# Altium integrated library Samtec_2,54_mm_Pitch_Socket_Strips.IntLib: 489 symbols (part 4 of 4)
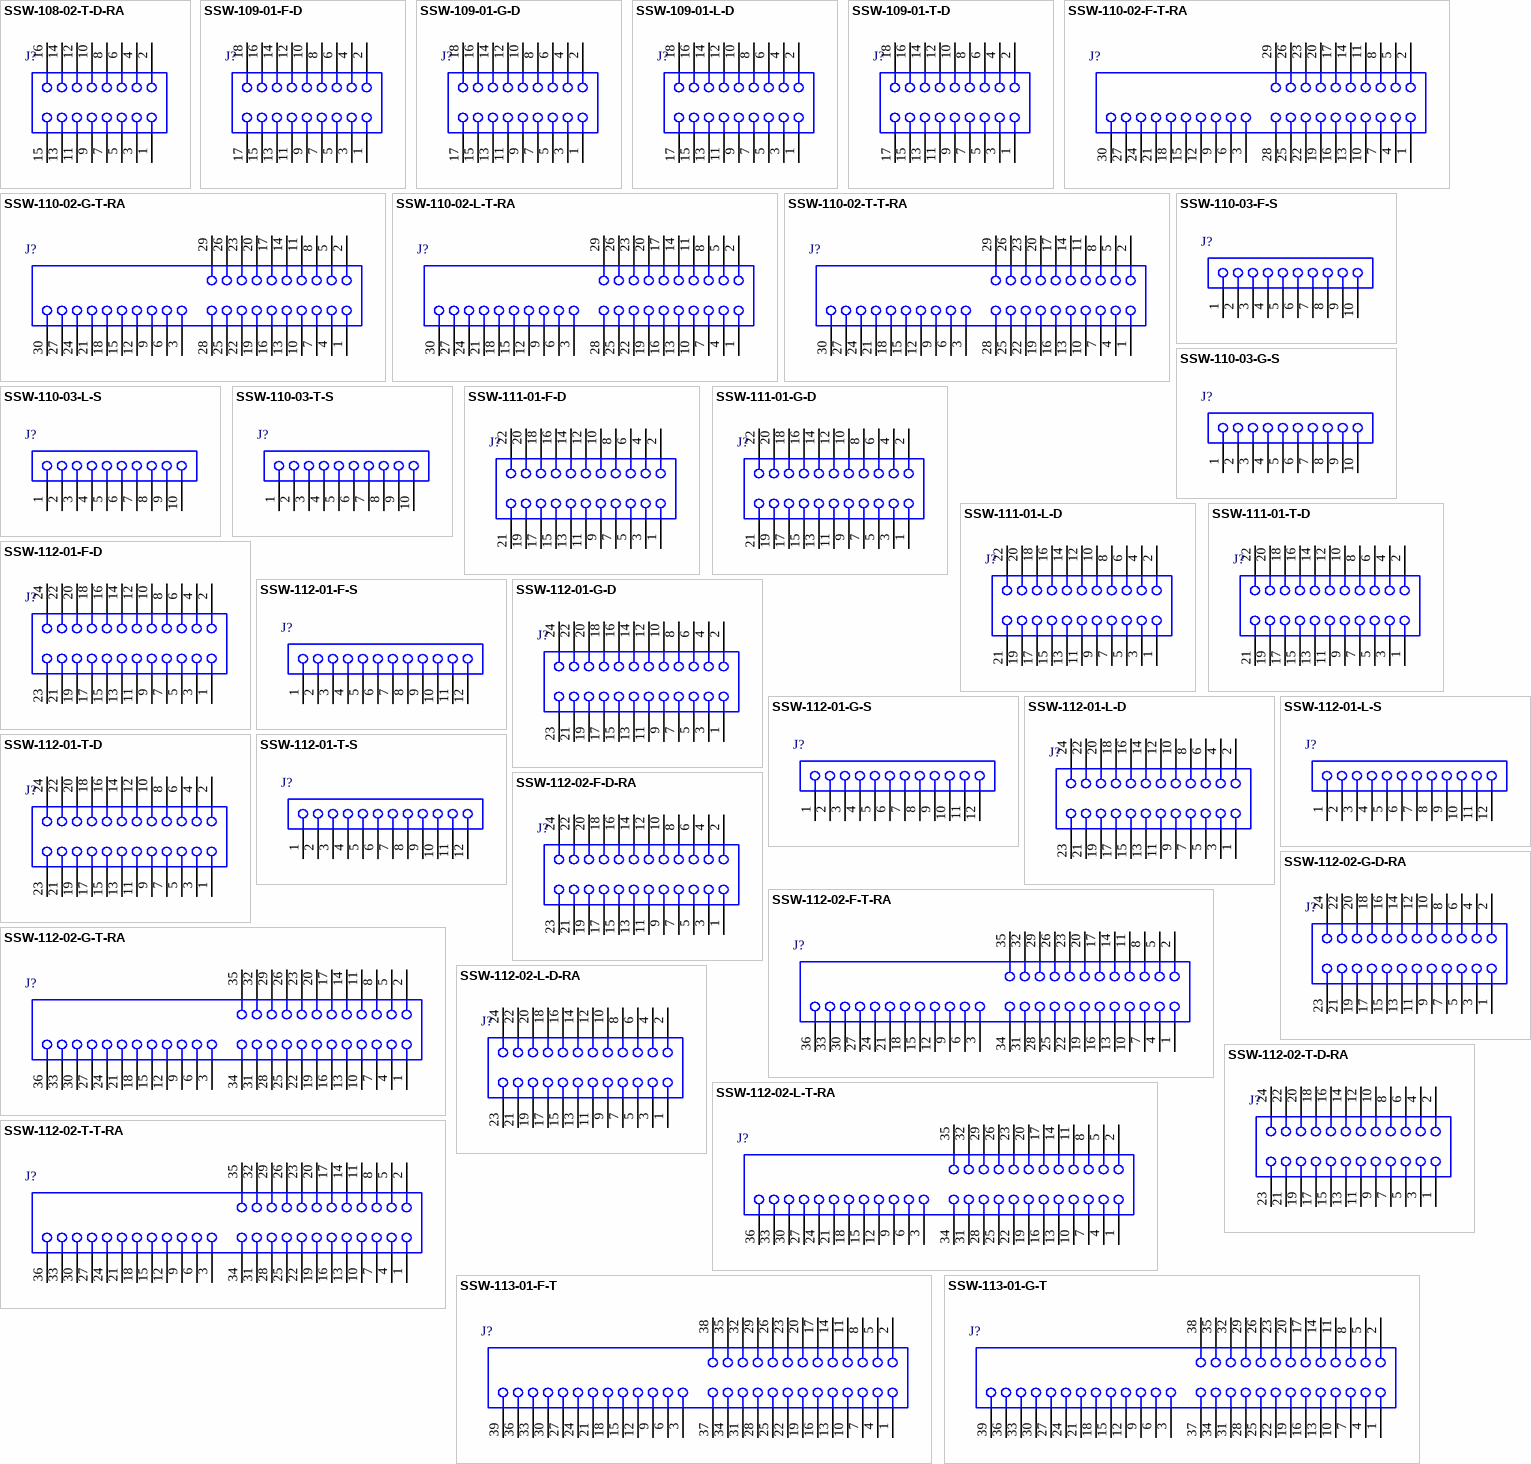
[diagram p16: symbols SSW-108-02-T-D-RA to SSW-113-01-G-T]

## SSW-112-01-L-S
designator J?
SQ Post Socket, Through-hole, Vertical, -55 to 125 degC, 2.54 mm Pitch, 12-Pin, Female, RoHS; Manufacturer: Samtec; PartNumber: SSW-112-01-L-S; Pitch: 2.54 mm; DatasheetVersion: F-214; PackageVersion: CA, 6/1987; PackageReference: SSW-112-01-X-S; PackageDescription: Assembly, Socket Strip .016 X .031 Tail; Orientation: Vertical; RoHS: True; Temperature Range: -55 to 125 degC; Mounting Technology: Through-hole; ComponentLink1Description: Manufacturer URL; ComponentLink1URL: http://www.samtec.com; ComponentLink2Description: Datasheet; ComponentLink2URL: http://www.samtec.com/documents/webfiles/pdf/SSW_TH.PDF; ComponentLink3Description: Package Specification; ComponentLink3URL: http://www.samtec.com/documents/webfiles/cpdf/SSW-1XX-XX-XXX-X-XX-XXX-XX-MKT.pdf
footprint SMTC-SSW-112-01-X-S (SQ Post Socket, 1x12 Pins, Vertical, 2.54mm Pitch, Female)
pins: 1, 2, 3, 4, 5, 6, 7, 8, 9, 10, 11, 12

## SSW-112-01-T-D
designator J?
SQ Post Socket, Through-hole, Vertical, -55 to 105 degC, 2.54 mm Pitch, 24-Pin, Female, RoHS; Manufacturer: Samtec; PartNumber: SSW-112-01-T-D; Pitch: 2.54 mm; DatasheetVersion: F-214; PackageVersion: CA, 6/1987; PackageReference: SSW-112-01-X-D; PackageDescription: Assembly, Socket Strip .016 X .031 Tail; Supplier 1: Digi-Key; Supplier Part Number 1: SAM1212-12-ND; Supplier 2: Newark; Supplier Part Number 2: 11P9507; Orientation: Vertical; RoHS: True; Temperature Range: -55 to 105 degC; Mounting Technology: Through-hole; ComponentLink1Description: Manufacturer URL; ComponentLink1URL: http://www.samtec.com; ComponentLink2Description: Datasheet; ComponentLink2URL: http://www.samtec.com/documents/webfiles/pdf/SSW_TH.PDF; ComponentLink3Description: Package Specification; ComponentLink3URL: http://www.samtec.com/documents/webfiles/cpdf/SSW-1XX-XX-XXX-X-XX-XXX-XX-MKT.pdf
footprint SMTC-SSW-112-01-X-D (SQ Post Socket, 2x12 Pins, Vertical, 2.54mm Pitch, Female)
pins: 1, 2, 3, 4, 5, 6, 7, 8, 9, 10, 11, 12, 13, 14, 15, 16, 17, 18, 19, 20, 21, 22, 23, 24

## SSW-112-01-T-S
designator J?
SQ Post Socket, Through-hole, Vertical, -55 to 105 degC, 2.54 mm Pitch, 12-Pin, Female, RoHS; Manufacturer: Samtec; PartNumber: SSW-112-01-T-S; Pitch: 2.54 mm; DatasheetVersion: F-214; PackageVersion: CA, 6/1987; PackageReference: SSW-112-01-X-S; PackageDescription: Assembly, Socket Strip .016 X .031 Tail; Supplier 1: Digi-Key; Supplier Part Number 1: SAM1213-12-ND; Supplier 2: Newark; Supplier Part Number 2: 11P9508; Orientation: Vertical; RoHS: True; Temperature Range: -55 to 105 degC; Mounting Technology: Through-hole; ComponentLink1Description: Manufacturer URL; ComponentLink1URL: http://www.samtec.com; ComponentLink2Description: Datasheet; ComponentLink2URL: http://www.samtec.com/documents/webfiles/pdf/SSW_TH.PDF; ComponentLink3Description: Package Specification; ComponentLink3URL: http://www.samtec.com/documents/webfiles/cpdf/SSW-1XX-XX-XXX-X-XX-XXX-XX-MKT.pdf
footprint SMTC-SSW-112-01-X-S (SQ Post Socket, 1x12 Pins, Vertical, 2.54mm Pitch, Female)
pins: 1, 2, 3, 4, 5, 6, 7, 8, 9, 10, 11, 12

## SSW-112-02-F-D-RA
designator J?
SQ Post Socket, Through-hole, Right Angle, -55 to 125 degC, 2.54 mm Pitch, 24-Pin, Female, RoHS; Manufacturer: Samtec; PartNumber: SSW-112-02-F-D-RA; Pitch: 2.54 mm; DatasheetVersion: F-214; PackageVersion: CA, 6/1987; PackageReference: SSW-112-02-X-D-RA; PackageDescription: Assembly, Socket Strip .016 X .031 Tail; Supplier 1: Newark; Supplier Part Number 1: 82P5836; Orientation: Right Angle; RoHS: True; Temperature Range: -55 to 125 degC; Mounting Technology: Through-hole; ComponentLink1Description: Manufacturer URL; ComponentLink1URL: http://www.samtec.com; ComponentLink2Description: Datasheet; ComponentLink2URL: http://www.samtec.com/documents/webfiles/pdf/SSW_TH.PDF; ComponentLink3Description: Package Specification; ComponentLink3URL: http://www.samtec.com/documents/webfiles/cpdf/SSW-1XX-XX-XXX-X-XX-XXX-XX-MKT.pdf
footprint SMTC-SSW-112-02-X-D-RA (SQ Post Socket, 2x12 Pins, Right Angle, 2.54mm Pitch, Female)
pins: 1, 2, 3, 4, 5, 6, 7, 8, 9, 10, 11, 12, 13, 14, 15, 16, 17, 18, 19, 20, 21, 22, 23, 24

## SSW-112-02-F-T-RA
designator J?
SQ Post Socket, Through-hole, Right Angle, -55 to 125 degC, 2.54 mm Pitch, 36-Pin, Female, RoHS; Manufacturer: Samtec; PartNumber: SSW-112-02-F-T-RA; Pitch: 2.54 mm; DatasheetVersion: F-214; PackageVersion: CA, 6/1987; PackageReference: SSW-112-02-X-T-RA; PackageDescription: Assembly, Socket Strip .016 X .031 Tail; Orientation: Right Angle; RoHS: True; Temperature Range: -55 to 125 degC; Mounting Technology: Through-hole; ComponentLink1Description: Manufacturer URL; ComponentLink1URL: http://www.samtec.com; ComponentLink2Description: Datasheet; ComponentLink2URL: http://www.samtec.com/documents/webfiles/pdf/SSW_TH.PDF; ComponentLink3Description: Package Specification; ComponentLink3URL: http://www.samtec.com/documents/webfiles/cpdf/SSW-1XX-XX-XXX-X-XX-XXX-XX-MKT.pdf
footprint SMTC-SSW-112-02-X-T-RA (SQ Post Socket, 3x12 Pins, Right Angle, 2.54mm Pitch, Female)
pins: 1, 2, 3, 4, 5, 6, 7, 8, 9, 10, 11, 12, 13, 14, 15, 16, 17, 18, 19, 20, 21, 22, 23, 24, 25, 26, 27, 28, 29, 30, 31, 32, 33, 34, 35, 36

## SSW-112-02-G-D-RA
designator J?
SQ Post Socket, Through-hole, Right Angle, -55 to 125 degC, 2.54 mm Pitch, 24-Pin, Female, RoHS; Manufacturer: Samtec; PartNumber: SSW-112-02-G-D-RA; Pitch: 2.54 mm; DatasheetVersion: F-214; PackageVersion: CA, 6/1987; PackageReference: SSW-112-02-X-D-RA; PackageDescription: Assembly, Socket Strip .016 X .031 Tail; Supplier 1: Digi-Key; Supplier Part Number 1: SAM1215-12-ND; Supplier 2: Newark; Supplier Part Number 2: 11P9510; Orientation: Right Angle; RoHS: True; Temperature Range: -55 to 125 degC; Mounting Technology: Through-hole; ComponentLink1Description: Manufacturer URL; ComponentLink1URL: http://www.samtec.com; ComponentLink2Description: Datasheet; ComponentLink2URL: http://www.samtec.com/documents/webfiles/pdf/SSW_TH.PDF; ComponentLink3Description: Package Specification; ComponentLink3URL: http://www.samtec.com/documents/webfiles/cpdf/SSW-1XX-XX-XXX-X-XX-XXX-XX-MKT.pdf
footprint SMTC-SSW-112-02-X-D-RA (SQ Post Socket, 2x12 Pins, Right Angle, 2.54mm Pitch, Female)
pins: 1, 2, 3, 4, 5, 6, 7, 8, 9, 10, 11, 12, 13, 14, 15, 16, 17, 18, 19, 20, 21, 22, 23, 24

## SSW-112-02-G-T-RA
designator J?
SQ Post Socket, Through-hole, Right Angle, -55 to 125 degC, 2.54 mm Pitch, 36-Pin, Female, RoHS; Manufacturer: Samtec; PartNumber: SSW-112-02-G-T-RA; Pitch: 2.54 mm; DatasheetVersion: F-214; PackageVersion: CA, 6/1987; PackageReference: SSW-112-02-X-T-RA; PackageDescription: Assembly, Socket Strip .016 X .031 Tail; Supplier 1: Newark; Supplier Part Number 1: 82P5862; Orientation: Right Angle; RoHS: True; Temperature Range: -55 to 125 degC; Mounting Technology: Through-hole; ComponentLink1Description: Manufacturer URL; ComponentLink1URL: http://www.samtec.com; ComponentLink2Description: Datasheet; ComponentLink2URL: http://www.samtec.com/documents/webfiles/pdf/SSW_TH.PDF; ComponentLink3Description: Package Specification; ComponentLink3URL: http://www.samtec.com/documents/webfiles/cpdf/SSW-1XX-XX-XXX-X-XX-XXX-XX-MKT.pdf
footprint SMTC-SSW-112-02-X-T-RA (SQ Post Socket, 3x12 Pins, Right Angle, 2.54mm Pitch, Female)
pins: 1, 2, 3, 4, 5, 6, 7, 8, 9, 10, 11, 12, 13, 14, 15, 16, 17, 18, 19, 20, 21, 22, 23, 24, 25, 26, 27, 28, 29, 30, 31, 32, 33, 34, 35, 36

## SSW-112-02-L-D-RA
designator J?
SQ Post Socket, Through-hole, Right Angle, -55 to 125 degC, 2.54 mm Pitch, 24-Pin, Female, RoHS; Manufacturer: Samtec; PartNumber: SSW-112-02-L-D-RA; Pitch: 2.54 mm; DatasheetVersion: F-214; PackageVersion: CA, 6/1987; PackageReference: SSW-112-02-X-D-RA; PackageDescription: Assembly, Socket Strip .016 X .031 Tail; Orientation: Right Angle; RoHS: True; Temperature Range: -55 to 125 degC; Mounting Technology: Through-hole; ComponentLink1Description: Manufacturer URL; ComponentLink1URL: http://www.samtec.com; ComponentLink2Description: Datasheet; ComponentLink2URL: http://www.samtec.com/documents/webfiles/pdf/SSW_TH.PDF; ComponentLink3Description: Package Specification; ComponentLink3URL: http://www.samtec.com/documents/webfiles/cpdf/SSW-1XX-XX-XXX-X-XX-XXX-XX-MKT.pdf
footprint SMTC-SSW-112-02-X-D-RA (SQ Post Socket, 2x12 Pins, Right Angle, 2.54mm Pitch, Female)
pins: 1, 2, 3, 4, 5, 6, 7, 8, 9, 10, 11, 12, 13, 14, 15, 16, 17, 18, 19, 20, 21, 22, 23, 24

## SSW-112-02-L-T-RA
designator J?
SQ Post Socket, Through-hole, Right Angle, -55 to 125 degC, 2.54 mm Pitch, 36-Pin, Female, RoHS; Manufacturer: Samtec; PartNumber: SSW-112-02-L-T-RA; Pitch: 2.54 mm; DatasheetVersion: F-214; PackageVersion: CA, 6/1987; PackageReference: SSW-112-02-X-T-RA; PackageDescription: Assembly, Socket Strip .016 X .031 Tail; Orientation: Right Angle; RoHS: True; Temperature Range: -55 to 125 degC; Mounting Technology: Through-hole; ComponentLink1Description: Manufacturer URL; ComponentLink1URL: http://www.samtec.com; ComponentLink2Description: Datasheet; ComponentLink2URL: http://www.samtec.com/documents/webfiles/pdf/SSW_TH.PDF; ComponentLink3Description: Package Specification; ComponentLink3URL: http://www.samtec.com/documents/webfiles/cpdf/SSW-1XX-XX-XXX-X-XX-XXX-XX-MKT.pdf
footprint SMTC-SSW-112-02-X-T-RA (SQ Post Socket, 3x12 Pins, Right Angle, 2.54mm Pitch, Female)
pins: 1, 2, 3, 4, 5, 6, 7, 8, 9, 10, 11, 12, 13, 14, 15, 16, 17, 18, 19, 20, 21, 22, 23, 24, 25, 26, 27, 28, 29, 30, 31, 32, 33, 34, 35, 36

## SSW-112-02-T-D-RA
designator J?
SQ Post Socket, Through-hole, Right Angle, -55 to 105 degC, 2.54 mm Pitch, 24-Pin, Female, RoHS; Manufacturer: Samtec; PartNumber: SSW-112-02-T-D-RA; Pitch: 2.54 mm; DatasheetVersion: F-214; PackageVersion: CA, 6/1987; PackageReference: SSW-112-02-X-D-RA; PackageDescription: Assembly, Socket Strip .016 X .031 Tail; Supplier 1: Newark; Supplier Part Number 1: 82P5889; Orientation: Right Angle; RoHS: True; Temperature Range: -55 to 105 degC; Mounting Technology: Through-hole; ComponentLink1Description: Manufacturer URL; ComponentLink1URL: http://www.samtec.com; ComponentLink2Description: Datasheet; ComponentLink2URL: http://www.samtec.com/documents/webfiles/pdf/SSW_TH.PDF; ComponentLink3Description: Package Specification; ComponentLink3URL: http://www.samtec.com/documents/webfiles/cpdf/SSW-1XX-XX-XXX-X-XX-XXX-XX-MKT.pdf
footprint SMTC-SSW-112-02-X-D-RA (SQ Post Socket, 2x12 Pins, Right Angle, 2.54mm Pitch, Female)
pins: 1, 2, 3, 4, 5, 6, 7, 8, 9, 10, 11, 12, 13, 14, 15, 16, 17, 18, 19, 20, 21, 22, 23, 24

## SSW-112-02-T-T-RA
designator J?
SQ Post Socket, Through-hole, Right Angle, -55 to 105 degC, 2.54 mm Pitch, 36-Pin, Female, RoHS; Manufacturer: Samtec; PartNumber: SSW-112-02-T-T-RA; Pitch: 2.54 mm; DatasheetVersion: F-214; PackageVersion: CA, 6/1987; PackageReference: SSW-112-02-X-T-RA; PackageDescription: Assembly, Socket Strip .016 X .031 Tail; Supplier 1: Newark; Supplier Part Number 1: 82P5899; Orientation: Right Angle; RoHS: True; Temperature Range: -55 to 105 degC; Mounting Technology: Through-hole; ComponentLink1Description: Manufacturer URL; ComponentLink1URL: http://www.samtec.com; ComponentLink2Description: Datasheet; ComponentLink2URL: http://www.samtec.com/documents/webfiles/pdf/SSW_TH.PDF; ComponentLink3Description: Package Specification; ComponentLink3URL: http://www.samtec.com/documents/webfiles/cpdf/SSW-1XX-XX-XXX-X-XX-XXX-XX-MKT.pdf
footprint SMTC-SSW-112-02-X-T-RA (SQ Post Socket, 3x12 Pins, Right Angle, 2.54mm Pitch, Female)
pins: 1, 2, 3, 4, 5, 6, 7, 8, 9, 10, 11, 12, 13, 14, 15, 16, 17, 18, 19, 20, 21, 22, 23, 24, 25, 26, 27, 28, 29, 30, 31, 32, 33, 34, 35, 36

## SSW-113-01-F-T
designator J?
SQ Post Socket, Through-hole, Vertical, -55 to 125 degC, 2.54 mm Pitch, 39-Pin, Female, RoHS; Manufacturer: Samtec; PartNumber: SSW-113-01-F-T; Pitch: 2.54 mm; DatasheetVersion: F-214; PackageVersion: CA, 6/1987; PackageReference: SSW-113-01-X-T; PackageDescription: Assembly, Socket Strip .016 X .031 Tail; Orientation: Vertical; RoHS: True; Temperature Range: -55 to 125 degC; Mounting Technology: Through-hole; ComponentLink1Description: Manufacturer URL; ComponentLink1URL: http://www.samtec.com; ComponentLink2Description: Datasheet; ComponentLink2URL: http://www.samtec.com/documents/webfiles/pdf/SSW_TH.PDF; ComponentLink3Description: Package Specification; ComponentLink3URL: http://www.samtec.com/documents/webfiles/cpdf/SSW-1XX-XX-XXX-X-XX-XXX-XX-MKT.pdf
footprint SMTC-SSW-113-01-X-T (SQ Post Socket, 3x13 Pins, Vertical, 2.54mm Pitch, Female)
pins: 1, 2, 3, 4, 5, 6, 7, 8, 9, 10, 11, 12, 13, 14, 15, 16, 17, 18, 19, 20, 21, 22, 23, 24, 25, 26, 27, 28, 29, 30, 31, 32, 33, 34, 35, 36, 37, 38, 39

## SSW-113-01-G-T
designator J?
SQ Post Socket, Through-hole, Vertical, -55 to 125 degC, 2.54 mm Pitch, 39-Pin, Female, RoHS; Manufacturer: Samtec; PartNumber: SSW-113-01-G-T; Pitch: 2.54 mm; DatasheetVersion: F-214; PackageVersion: CA, 6/1987; PackageReference: SSW-113-01-X-T; PackageDescription: Assembly, Socket Strip .016 X .031 Tail; Supplier 1: Newark; Supplier Part Number 1: 82P6213; Orientation: Vertical; RoHS: True; Temperature Range: -55 to 125 degC; Mounting Technology: Through-hole; ComponentLink1Description: Manufacturer URL; ComponentLink1URL: http://www.samtec.com; ComponentLink2Description: Datasheet; ComponentLink2URL: http://www.samtec.com/documents/webfiles/pdf/SSW_TH.PDF; ComponentLink3Description: Package Specification; ComponentLink3URL: http://www.samtec.com/documents/webfiles/cpdf/SSW-1XX-XX-XXX-X-XX-XXX-XX-MKT.pdf
footprint SMTC-SSW-113-01-X-T (SQ Post Socket, 3x13 Pins, Vertical, 2.54mm Pitch, Female)
pins: 1, 2, 3, 4, 5, 6, 7, 8, 9, 10, 11, 12, 13, 14, 15, 16, 17, 18, 19, 20, 21, 22, 23, 24, 25, 26, 27, 28, 29, 30, 31, 32, 33, 34, 35, 36, 37, 38, 39

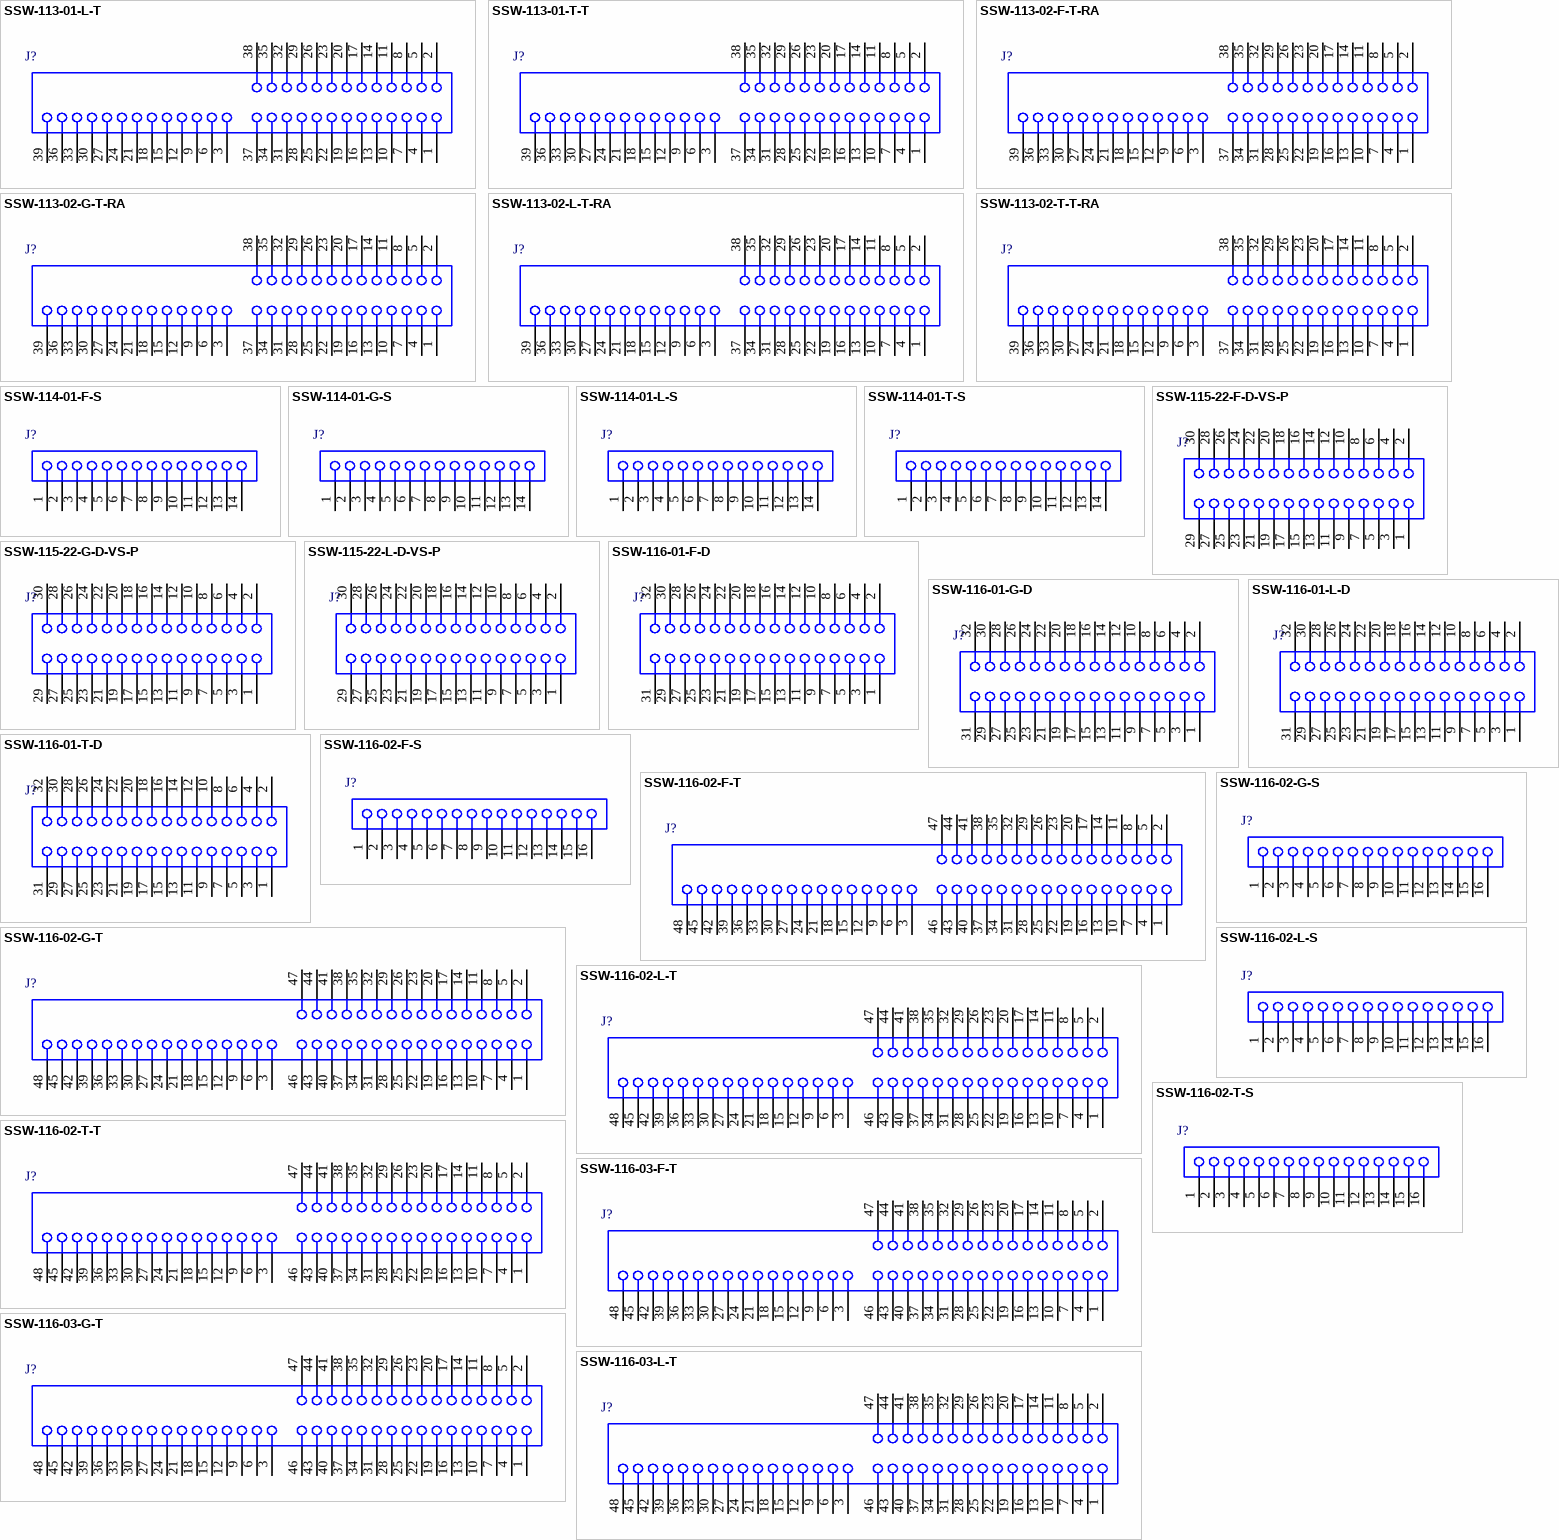
[diagram p11: symbols SSW-113-01-L-T to SSW-116-03-L-T]

## SSW-113-01-L-T
designator J?
SQ Post Socket, Through-hole, Vertical, -55 to 125 degC, 2.54 mm Pitch, 39-Pin, Female, RoHS; Manufacturer: Samtec; PartNumber: SSW-113-01-L-T; Pitch: 2.54 mm; DatasheetVersion: F-214; PackageVersion: CA, 6/1987; PackageReference: SSW-113-01-X-T; PackageDescription: Assembly, Socket Strip .016 X .031 Tail; Orientation: Vertical; RoHS: True; Temperature Range: -55 to 125 degC; Mounting Technology: Through-hole; ComponentLink1Description: Manufacturer URL; ComponentLink1URL: http://www.samtec.com; ComponentLink2Description: Datasheet; ComponentLink2URL: http://www.samtec.com/documents/webfiles/pdf/SSW_TH.PDF; ComponentLink3Description: Package Specification; ComponentLink3URL: http://www.samtec.com/documents/webfiles/cpdf/SSW-1XX-XX-XXX-X-XX-XXX-XX-MKT.pdf
footprint SMTC-SSW-113-01-X-T (SQ Post Socket, 3x13 Pins, Vertical, 2.54mm Pitch, Female)
pins: 1, 2, 3, 4, 5, 6, 7, 8, 9, 10, 11, 12, 13, 14, 15, 16, 17, 18, 19, 20, 21, 22, 23, 24, 25, 26, 27, 28, 29, 30, 31, 32, 33, 34, 35, 36, 37, 38, 39

## SSW-113-01-T-T
designator J?
SQ Post Socket, Through-hole, Vertical, -55 to 105 degC, 2.54 mm Pitch, 39-Pin, Female, RoHS; Manufacturer: Samtec; PartNumber: SSW-113-01-T-T; Pitch: 2.54 mm; DatasheetVersion: F-214; PackageVersion: CA, 6/1987; PackageReference: SSW-113-01-X-T; PackageDescription: Assembly, Socket Strip .016 X .031 Tail; Supplier 1: Newark; Supplier Part Number 1: 82P6233; Orientation: Vertical; RoHS: True; Temperature Range: -55 to 105 degC; Mounting Technology: Through-hole; ComponentLink1Description: Manufacturer URL; ComponentLink1URL: http://www.samtec.com; ComponentLink2Description: Datasheet; ComponentLink2URL: http://www.samtec.com/documents/webfiles/pdf/SSW_TH.PDF; ComponentLink3Description: Package Specification; ComponentLink3URL: http://www.samtec.com/documents/webfiles/cpdf/SSW-1XX-XX-XXX-X-XX-XXX-XX-MKT.pdf
footprint SMTC-SSW-113-01-X-T (SQ Post Socket, 3x13 Pins, Vertical, 2.54mm Pitch, Female)
pins: 1, 2, 3, 4, 5, 6, 7, 8, 9, 10, 11, 12, 13, 14, 15, 16, 17, 18, 19, 20, 21, 22, 23, 24, 25, 26, 27, 28, 29, 30, 31, 32, 33, 34, 35, 36, 37, 38, 39

## SSW-113-02-F-T-RA
designator J?
SQ Post Socket, Through-hole, Right Angle, -55 to 125 degC, 2.54 mm Pitch, 39-Pin, Female, RoHS; Manufacturer: Samtec; PartNumber: SSW-113-02-F-T-RA; Pitch: 2.54 mm; DatasheetVersion: F-214; PackageVersion: CA, 6/1987; PackageReference: SSW-113-02-X-T-RA; PackageDescription: Assembly, Socket Strip .016 X .031 Tail; Orientation: Right Angle; RoHS: True; Temperature Range: -55 to 125 degC; Mounting Technology: Through-hole; ComponentLink1Description: Manufacturer URL; ComponentLink1URL: http://www.samtec.com; ComponentLink2Description: Datasheet; ComponentLink2URL: http://www.samtec.com/documents/webfiles/pdf/SSW_TH.PDF; ComponentLink3Description: Package Specification; ComponentLink3URL: http://www.samtec.com/documents/webfiles/cpdf/SSW-1XX-XX-XXX-X-XX-XXX-XX-MKT.pdf
footprint SMTC-SSW-113-02-X-T-RA (SQ Post Socket, 3x13 Pins, Right Angle, 2.54mm Pitch, Female)
pins: 1, 2, 3, 4, 5, 6, 7, 8, 9, 10, 11, 12, 13, 14, 15, 16, 17, 18, 19, 20, 21, 22, 23, 24, 25, 26, 27, 28, 29, 30, 31, 32, 33, 34, 35, 36, 37, 38, 39

## SSW-113-02-G-T-RA
designator J?
SQ Post Socket, Through-hole, Right Angle, -55 to 125 degC, 2.54 mm Pitch, 39-Pin, Female, RoHS; Manufacturer: Samtec; PartNumber: SSW-113-02-G-T-RA; Pitch: 2.54 mm; DatasheetVersion: F-214; PackageVersion: CA, 6/1987; PackageReference: SSW-113-02-X-T-RA; PackageDescription: Assembly, Socket Strip .016 X .031 Tail; Supplier 1: Newark; Supplier Part Number 1: 82P6261; Orientation: Right Angle; RoHS: True; Temperature Range: -55 to 125 degC; Mounting Technology: Through-hole; ComponentLink1Description: Manufacturer URL; ComponentLink1URL: http://www.samtec.com; ComponentLink2Description: Datasheet; ComponentLink2URL: http://www.samtec.com/documents/webfiles/pdf/SSW_TH.PDF; ComponentLink3Description: Package Specification; ComponentLink3URL: http://www.samtec.com/documents/webfiles/cpdf/SSW-1XX-XX-XXX-X-XX-XXX-XX-MKT.pdf
footprint SMTC-SSW-113-02-X-T-RA (SQ Post Socket, 3x13 Pins, Right Angle, 2.54mm Pitch, Female)
pins: 1, 2, 3, 4, 5, 6, 7, 8, 9, 10, 11, 12, 13, 14, 15, 16, 17, 18, 19, 20, 21, 22, 23, 24, 25, 26, 27, 28, 29, 30, 31, 32, 33, 34, 35, 36, 37, 38, 39

## SSW-113-02-L-T-RA
designator J?
SQ Post Socket, Through-hole, Right Angle, -55 to 125 degC, 2.54 mm Pitch, 39-Pin, Female, RoHS; Manufacturer: Samtec; PartNumber: SSW-113-02-L-T-RA; Pitch: 2.54 mm; DatasheetVersion: F-214; PackageVersion: CA, 6/1987; PackageReference: SSW-113-02-X-T-RA; PackageDescription: Assembly, Socket Strip .016 X .031 Tail; Orientation: Right Angle; RoHS: True; Temperature Range: -55 to 125 degC; Mounting Technology: Through-hole; ComponentLink1Description: Manufacturer URL; ComponentLink1URL: http://www.samtec.com; ComponentLink2Description: Datasheet; ComponentLink2URL: http://www.samtec.com/documents/webfiles/pdf/SSW_TH.PDF; ComponentLink3Description: Package Specification; ComponentLink3URL: http://www.samtec.com/documents/webfiles/cpdf/SSW-1XX-XX-XXX-X-XX-XXX-XX-MKT.pdf
footprint SMTC-SSW-113-02-X-T-RA (SQ Post Socket, 3x13 Pins, Right Angle, 2.54mm Pitch, Female)
pins: 1, 2, 3, 4, 5, 6, 7, 8, 9, 10, 11, 12, 13, 14, 15, 16, 17, 18, 19, 20, 21, 22, 23, 24, 25, 26, 27, 28, 29, 30, 31, 32, 33, 34, 35, 36, 37, 38, 39

## SSW-113-02-T-T-RA
designator J?
SQ Post Socket, Through-hole, Right Angle, -55 to 105 degC, 2.54 mm Pitch, 39-Pin, Female, RoHS; Manufacturer: Samtec; PartNumber: SSW-113-02-T-T-RA; Pitch: 2.54 mm; DatasheetVersion: F-214; PackageVersion: CA, 6/1987; PackageReference: SSW-113-02-X-T-RA; PackageDescription: Assembly, Socket Strip .016 X .031 Tail; Supplier 1: Newark; Supplier Part Number 1: 82P6285; Orientation: Right Angle; RoHS: True; Temperature Range: -55 to 105 degC; Mounting Technology: Through-hole; ComponentLink1Description: Manufacturer URL; ComponentLink1URL: http://www.samtec.com; ComponentLink2Description: Datasheet; ComponentLink2URL: http://www.samtec.com/documents/webfiles/pdf/SSW_TH.PDF; ComponentLink3Description: Package Specification; ComponentLink3URL: http://www.samtec.com/documents/webfiles/cpdf/SSW-1XX-XX-XXX-X-XX-XXX-XX-MKT.pdf
footprint SMTC-SSW-113-02-X-T-RA (SQ Post Socket, 3x13 Pins, Right Angle, 2.54mm Pitch, Female)
pins: 1, 2, 3, 4, 5, 6, 7, 8, 9, 10, 11, 12, 13, 14, 15, 16, 17, 18, 19, 20, 21, 22, 23, 24, 25, 26, 27, 28, 29, 30, 31, 32, 33, 34, 35, 36, 37, 38, 39

## SSW-114-01-F-S
designator J?
SQ Post Socket, Through-hole, Vertical, -55 to 125 degC, 2.54 mm Pitch, 14-Pin, Female, RoHS; Manufacturer: Samtec; PartNumber: SSW-114-01-F-S; Pitch: 2.54 mm; DatasheetVersion: F-214; PackageVersion: CA, 6/1987; PackageReference: SSW-114-01-X-S; PackageDescription: Assembly, Socket Strip .016 X .031 Tail; Orientation: Vertical; RoHS: True; Temperature Range: -55 to 125 degC; Mounting Technology: Through-hole; ComponentLink1Description: Manufacturer URL; ComponentLink1URL: http://www.samtec.com; ComponentLink2Description: Datasheet; ComponentLink2URL: http://www.samtec.com/documents/webfiles/pdf/SSW_TH.PDF; ComponentLink3Description: Package Specification; ComponentLink3URL: http://www.samtec.com/documents/webfiles/cpdf/SSW-1XX-XX-XXX-X-XX-XXX-XX-MKT.pdf
footprint SMTC-SSW-114-01-X-S (SQ Post Socket, 1x14 Pins, Vertical, 2.54mm Pitch, Female)
pins: 1, 2, 3, 4, 5, 6, 7, 8, 9, 10, 11, 12, 13, 14

## SSW-114-01-G-S
designator J?
SQ Post Socket, Through-hole, Vertical, -55 to 125 degC, 2.54 mm Pitch, 14-Pin, Female, RoHS; Manufacturer: Samtec; PartNumber: SSW-114-01-G-S; Pitch: 2.54 mm; DatasheetVersion: F-214; PackageVersion: CA, 6/1987; PackageReference: SSW-114-01-X-S; PackageDescription: Assembly, Socket Strip .016 X .031 Tail; Supplier 1: Digi-Key; Supplier Part Number 1: SAM1209-14-ND; Supplier 2: Newark; Supplier Part Number 2: 11P9538; Orientation: Vertical; RoHS: True; Temperature Range: -55 to 125 degC; Mounting Technology: Through-hole; ComponentLink1Description: Manufacturer URL; ComponentLink1URL: http://www.samtec.com; ComponentLink2Description: Datasheet; ComponentLink2URL: http://www.samtec.com/documents/webfiles/pdf/SSW_TH.PDF; ComponentLink3Description: Package Specification; ComponentLink3URL: http://www.samtec.com/documents/webfiles/cpdf/SSW-1XX-XX-XXX-X-XX-XXX-XX-MKT.pdf
footprint SMTC-SSW-114-01-X-S (SQ Post Socket, 1x14 Pins, Vertical, 2.54mm Pitch, Female)
pins: 1, 2, 3, 4, 5, 6, 7, 8, 9, 10, 11, 12, 13, 14

## SSW-114-01-L-S
designator J?
SQ Post Socket, Through-hole, Vertical, -55 to 125 degC, 2.54 mm Pitch, 14-Pin, Female, RoHS; Manufacturer: Samtec; PartNumber: SSW-114-01-L-S; Pitch: 2.54 mm; DatasheetVersion: F-214; PackageVersion: CA, 6/1987; PackageReference: SSW-114-01-X-S; PackageDescription: Assembly, Socket Strip .016 X .031 Tail; Orientation: Vertical; RoHS: True; Temperature Range: -55 to 125 degC; Mounting Technology: Through-hole; ComponentLink1Description: Manufacturer URL; ComponentLink1URL: http://www.samtec.com; ComponentLink2Description: Datasheet; ComponentLink2URL: http://www.samtec.com/documents/webfiles/pdf/SSW_TH.PDF; ComponentLink3Description: Package Specification; ComponentLink3URL: http://www.samtec.com/documents/webfiles/cpdf/SSW-1XX-XX-XXX-X-XX-XXX-XX-MKT.pdf
footprint SMTC-SSW-114-01-X-S (SQ Post Socket, 1x14 Pins, Vertical, 2.54mm Pitch, Female)
pins: 1, 2, 3, 4, 5, 6, 7, 8, 9, 10, 11, 12, 13, 14

## SSW-114-01-T-S
designator J?
SQ Post Socket, Through-hole, Vertical, -55 to 105 degC, 2.54 mm Pitch, 14-Pin, Female, RoHS; Manufacturer: Samtec; PartNumber: SSW-114-01-T-S; Pitch: 2.54 mm; DatasheetVersion: F-214; PackageVersion: CA, 6/1987; PackageReference: SSW-114-01-X-S; PackageDescription: Assembly, Socket Strip .016 X .031 Tail; Supplier 1: Digi-Key; Supplier Part Number 1: SAM1213-14-ND; Supplier 2: Newark; Supplier Part Number 2: 11P9542; Orientation: Vertical; RoHS: True; Temperature Range: -55 to 105 degC; Mounting Technology: Through-hole; ComponentLink1Description: Manufacturer URL; ComponentLink1URL: http://www.samtec.com; ComponentLink2Description: Datasheet; ComponentLink2URL: http://www.samtec.com/documents/webfiles/pdf/SSW_TH.PDF; ComponentLink3Description: Package Specification; ComponentLink3URL: http://www.samtec.com/documents/webfiles/cpdf/SSW-1XX-XX-XXX-X-XX-XXX-XX-MKT.pdf
footprint SMTC-SSW-114-01-X-S (SQ Post Socket, 1x14 Pins, Vertical, 2.54mm Pitch, Female)
pins: 1, 2, 3, 4, 5, 6, 7, 8, 9, 10, 11, 12, 13, 14

## SSW-115-22-F-D-VS-P
designator J?
SQ Post Socket, Surface Mount, Vertical, -55 to 125 degC, 2.54 mm Pitch, 30-Pin, Female, RoHS; Manufacturer: Samtec; PartNumber: SSW-115-22-F-D-VS-P; Pitch: 2.54 mm; DatasheetVersion: F-214; PackageVersion: AS, 1/1997; PackageReference: SSW-115-22-X-D-VS-P; PackageDescription: .100 [2.54] Surface Mount Assembly; Orientation: Vertical; RoHS: True; Temperature Range: -55 to 125 degC; Mounting Technology: Surface Mount; ComponentLink1Description: Manufacturer URL; ComponentLink1URL: http://www.samtec.com; ComponentLink2Description: Datasheet; ComponentLink2URL: http://www.samtec.com/documents/webfiles/pdf/SSW_SM.PDF; ComponentLink3Description: Package Specification; ComponentLink3URL: http://www.samtec.com/documents/webfiles/cpdf/SSW-1XX-22-XXX-X-XX-XX-X-XX-MKT.pdf
footprint SMTC-SSW-115-22-X-D-VS-P (SQ Post Socket, 2x15 Pins, Vertical, 2.54mm Pitch, Female)
pins: 1, 2, 3, 4, 5, 6, 7, 8, 9, 10, 11, 12, 13, 14, 15, 16, 17, 18, 19, 20, 21, 22, 23, 24, 25, 26, 27, 28, 29, 30

## SSW-115-22-G-D-VS-P
designator J?
SQ Post Socket, Surface Mount, Vertical, -55 to 125 degC, 2.54 mm Pitch, 30-Pin, Female, RoHS; Manufacturer: Samtec; PartNumber: SSW-115-22-G-D-VS-P; Pitch: 2.54 mm; DatasheetVersion: F-214; PackageVersion: AS, 1/1997; PackageReference: SSW-115-22-X-D-VS-P; PackageDescription: .100 [2.54] Surface Mount Assembly; Orientation: Vertical; RoHS: True; Temperature Range: -55 to 125 degC; Mounting Technology: Surface Mount; ComponentLink1Description: Manufacturer URL; ComponentLink1URL: http://www.samtec.com; ComponentLink2Description: Datasheet; ComponentLink2URL: http://www.samtec.com/documents/webfiles/pdf/SSW_SM.PDF; ComponentLink3Description: Package Specification; ComponentLink3URL: http://www.samtec.com/documents/webfiles/cpdf/SSW-1XX-22-XXX-X-XX-XX-X-XX-MKT.pdf
footprint SMTC-SSW-115-22-X-D-VS-P (SQ Post Socket, 2x15 Pins, Vertical, 2.54mm Pitch, Female)
pins: 1, 2, 3, 4, 5, 6, 7, 8, 9, 10, 11, 12, 13, 14, 15, 16, 17, 18, 19, 20, 21, 22, 23, 24, 25, 26, 27, 28, 29, 30

## SSW-115-22-L-D-VS-P
designator J?
SQ Post Socket, Surface Mount, Vertical, -55 to 125 degC, 2.54 mm Pitch, 30-Pin, Female, RoHS; Manufacturer: Samtec; PartNumber: SSW-115-22-L-D-VS-P; Pitch: 2.54 mm; DatasheetVersion: F-214; PackageVersion: AS, 1/1997; PackageReference: SSW-115-22-X-D-VS-P; PackageDescription: .100 [2.54] Surface Mount Assembly; Orientation: Vertical; RoHS: True; Temperature Range: -55 to 125 degC; Mounting Technology: Surface Mount; ComponentLink1Description: Manufacturer URL; ComponentLink1URL: http://www.samtec.com; ComponentLink2Description: Datasheet; ComponentLink2URL: http://www.samtec.com/documents/webfiles/pdf/SSW_SM.PDF; ComponentLink3Description: Package Specification; ComponentLink3URL: http://www.samtec.com/documents/webfiles/cpdf/SSW-1XX-22-XXX-X-XX-XX-X-XX-MKT.pdf
footprint SMTC-SSW-115-22-X-D-VS-P (SQ Post Socket, 2x15 Pins, Vertical, 2.54mm Pitch, Female)
pins: 1, 2, 3, 4, 5, 6, 7, 8, 9, 10, 11, 12, 13, 14, 15, 16, 17, 18, 19, 20, 21, 22, 23, 24, 25, 26, 27, 28, 29, 30

## SSW-116-01-F-D
designator J?
SQ Post Socket, Through-hole, Vertical, -55 to 125 degC, 2.54 mm Pitch, 32-Pin, Female, RoHS; Manufacturer: Samtec; PartNumber: SSW-116-01-F-D; Pitch: 2.54 mm; DatasheetVersion: F-214; PackageVersion: CA, 6/1987; PackageReference: SSW-116-01-X-D; PackageDescription: Assembly, Socket Strip .016 X .031 Tail; Supplier 1: Newark; Supplier Part Number 1: 82P7180; Orientation: Vertical; RoHS: True; Temperature Range: -55 to 125 degC; Mounting Technology: Through-hole; ComponentLink1Description: Manufacturer URL; ComponentLink1URL: http://www.samtec.com; ComponentLink2Description: Datasheet; ComponentLink2URL: http://www.samtec.com/documents/webfiles/pdf/SSW_TH.PDF; ComponentLink3Description: Package Specification; ComponentLink3URL: http://www.samtec.com/documents/webfiles/cpdf/SSW-1XX-XX-XXX-X-XX-XXX-XX-MKT.pdf
footprint SMTC-SSW-116-01-X-D (SQ Post Socket, 2x16 Pins, Vertical, 2.54mm Pitch, Female)
pins: 1, 2, 3, 4, 5, 6, 7, 8, 9, 10, 11, 12, 13, 14, 15, 16, 17, 18, 19, 20, 21, 22, 23, 24, 25, 26, 27, 28, 29, 30, 31, 32

## SSW-116-01-G-D
designator J?
SQ Post Socket, Through-hole, Vertical, -55 to 125 degC, 2.54 mm Pitch, 32-Pin, Female, RoHS; Manufacturer: Samtec; PartNumber: SSW-116-01-G-D; Pitch: 2.54 mm; DatasheetVersion: F-214; PackageVersion: CA, 6/1987; PackageReference: SSW-116-01-X-D; PackageDescription: Assembly, Socket Strip .016 X .031 Tail; Supplier 1: Digi-Key; Supplier Part Number 1: SAM1208-16-ND; Supplier 2: Newark; Supplier Part Number 2: 11P9569; Orientation: Vertical; RoHS: True; Temperature Range: -55 to 125 degC; Mounting Technology: Through-hole; ComponentLink1Description: Manufacturer URL; ComponentLink1URL: http://www.samtec.com; ComponentLink2Description: Datasheet; ComponentLink2URL: http://www.samtec.com/documents/webfiles/pdf/SSW_TH.PDF; ComponentLink3Description: Package Specification; ComponentLink3URL: http://www.samtec.com/documents/webfiles/cpdf/SSW-1XX-XX-XXX-X-XX-XXX-XX-MKT.pdf
footprint SMTC-SSW-116-01-X-D (SQ Post Socket, 2x16 Pins, Vertical, 2.54mm Pitch, Female)
pins: 1, 2, 3, 4, 5, 6, 7, 8, 9, 10, 11, 12, 13, 14, 15, 16, 17, 18, 19, 20, 21, 22, 23, 24, 25, 26, 27, 28, 29, 30, 31, 32

## SSW-116-01-L-D
designator J?
SQ Post Socket, Through-hole, Vertical, -55 to 125 degC, 2.54 mm Pitch, 32-Pin, Female, RoHS; Manufacturer: Samtec; PartNumber: SSW-116-01-L-D; Pitch: 2.54 mm; DatasheetVersion: F-214; PackageVersion: CA, 6/1987; PackageReference: SSW-116-01-X-D; PackageDescription: Assembly, Socket Strip .016 X .031 Tail; Orientation: Vertical; RoHS: True; Temperature Range: -55 to 125 degC; Mounting Technology: Through-hole; ComponentLink1Description: Manufacturer URL; ComponentLink1URL: http://www.samtec.com; ComponentLink2Description: Datasheet; ComponentLink2URL: http://www.samtec.com/documents/webfiles/pdf/SSW_TH.PDF; ComponentLink3Description: Package Specification; ComponentLink3URL: http://www.samtec.com/documents/webfiles/cpdf/SSW-1XX-XX-XXX-X-XX-XXX-XX-MKT.pdf
footprint SMTC-SSW-116-01-X-D (SQ Post Socket, 2x16 Pins, Vertical, 2.54mm Pitch, Female)
pins: 1, 2, 3, 4, 5, 6, 7, 8, 9, 10, 11, 12, 13, 14, 15, 16, 17, 18, 19, 20, 21, 22, 23, 24, 25, 26, 27, 28, 29, 30, 31, 32

## SSW-116-01-T-D
designator J?
SQ Post Socket, Through-hole, Vertical, -55 to 105 degC, 2.54 mm Pitch, 32-Pin, Female, RoHS; Manufacturer: Samtec; PartNumber: SSW-116-01-T-D; Pitch: 2.54 mm; DatasheetVersion: F-214; PackageVersion: CA, 6/1987; PackageReference: SSW-116-01-X-D; PackageDescription: Assembly, Socket Strip .016 X .031 Tail; Supplier 1: Digi-Key; Supplier Part Number 1: SAM1212-16-ND; Supplier 2: Newark; Supplier Part Number 2: 11P9571; Orientation: Vertical; RoHS: True; Temperature Range: -55 to 105 degC; Mounting Technology: Through-hole; ComponentLink1Description: Manufacturer URL; ComponentLink1URL: http://www.samtec.com; ComponentLink2Description: Datasheet; ComponentLink2URL: http://www.samtec.com/documents/webfiles/pdf/SSW_TH.PDF; ComponentLink3Description: Package Specification; ComponentLink3URL: http://www.samtec.com/documents/webfiles/cpdf/SSW-1XX-XX-XXX-X-XX-XXX-XX-MKT.pdf
footprint SMTC-SSW-116-01-X-D (SQ Post Socket, 2x16 Pins, Vertical, 2.54mm Pitch, Female)
pins: 1, 2, 3, 4, 5, 6, 7, 8, 9, 10, 11, 12, 13, 14, 15, 16, 17, 18, 19, 20, 21, 22, 23, 24, 25, 26, 27, 28, 29, 30, 31, 32

## SSW-116-02-F-S
designator J?
SQ Post Socket, Through-hole, Vertical, -55 to 125 degC, 2.54 mm Pitch, 16-Pin, Female, RoHS; Manufacturer: Samtec; PartNumber: SSW-116-02-F-S; Pitch: 2.54 mm; DatasheetVersion: F-214; PackageVersion: CA, 6/1987; PackageReference: SSW-116-02-X-S; PackageDescription: Assembly, Socket Strip .016 X .031 Tail; Supplier 1: Newark; Supplier Part Number 1: 82P7234; Orientation: Vertical; RoHS: True; Temperature Range: -55 to 125 degC; Mounting Technology: Through-hole; ComponentLink1Description: Manufacturer URL; ComponentLink1URL: http://www.samtec.com; ComponentLink2Description: Datasheet; ComponentLink2URL: http://www.samtec.com/documents/webfiles/pdf/SSW_TH.PDF; ComponentLink3Description: Package Specification; ComponentLink3URL: http://www.samtec.com/documents/webfiles/pdf/SSW_TH.PDF
footprint SMTC-SSW-116-02-X-S (SQ Post Socket, 1x16 Pins, Vertical, 2.54mm Pitch, Female)
pins: 1, 2, 3, 4, 5, 6, 7, 8, 9, 10, 11, 12, 13, 14, 15, 16

## SSW-116-02-F-T
designator J?
SQ Post Socket, Through-hole, Vertical, -55 to 125 degC, 2.54 mm Pitch, 48-Pin, Female, RoHS; Manufacturer: Samtec; PartNumber: SSW-116-02-F-T; Pitch: 2.54 mm; DatasheetVersion: F-214; PackageVersion: CA, 6/1987; PackageReference: SSW-116-02-X-T; PackageDescription: Assembly, Socket Strip .016 X .031 Tail; Orientation: Vertical; RoHS: True; Temperature Range: -55 to 125 degC; Mounting Technology: Through-hole; ComponentLink1Description: Manufacturer URL; ComponentLink1URL: http://www.samtec.com; ComponentLink2Description: Datasheet; ComponentLink2URL: http://www.samtec.com/documents/webfiles/pdf/SSW_TH.PDF; ComponentLink3Description: Package Specification; ComponentLink3URL: http://www.samtec.com/documents/webfiles/cpdf/SSW-1XX-XX-XXX-X-XX-XXX-XX-MKT.pdf
footprint SMTC-SSW-116-02-X-T (SQ Post Socket, 3x16 Pins, Vertical, 2.54mm Pitch, Female)
pins: 1, 2, 3, 4, 5, 6, 7, 8, 9, 10, 11, 12, 13, 14, 15, 16, 17, 18, 19, 20, 21, 22, 23, 24, 25, 26, 27, 28, 29, 30, 31, 32, 33, 34, 35, 36, 37, 38, 39, 40, 41, 42, 43, 44, 45, 46, 47, 48

## SSW-116-02-G-S
designator J?
SQ Post Socket, Through-hole, Vertical, -55 to 125 degC, 2.54 mm Pitch, 16-Pin, Female, RoHS; Manufacturer: Samtec; PartNumber: SSW-116-02-G-S; Pitch: 2.54 mm; DatasheetVersion: F-214; PackageVersion: CA, 6/1987; PackageReference: SSW-116-02-X-S; PackageDescription: Assembly, Socket Strip .016 X .031 Tail; Supplier 1: Digi-Key; Supplier Part Number 1: SAM1216-16-ND; Supplier 2: Farnell; Supplier Part Number 2: 1668394; Supplier 3: Newark; Supplier Part Number 3: 15P2924; Supplier 4: Newark; Supplier Part Number 4: 11P9575; Orientation: Vertical; RoHS: True; Temperature Range: -55 to 125 degC; Mounting Technology: Through-hole; ComponentLink1Description: Manufacturer URL; ComponentLink1URL: http://www.samtec.com; ComponentLink2Description: Datasheet; ComponentLink2URL: http://www.samtec.com/documents/webfiles/pdf/SSW_TH.PDF; ComponentLink3Description: Package Specification; ComponentLink3URL: http://www.samtec.com/documents/webfiles/cpdf/SSW-1XX-XX-XXX-X-XX-XXX-XX-MKT.pdf
footprint SMTC-SSW-116-02-X-S (SQ Post Socket, 1x16 Pins, Vertical, 2.54mm Pitch, Female)
pins: 1, 2, 3, 4, 5, 6, 7, 8, 9, 10, 11, 12, 13, 14, 15, 16

## SSW-116-02-G-T
designator J?
SQ Post Socket, Through-hole, Vertical, -55 to 125 degC, 2.54 mm Pitch, 48-Pin, Female, RoHS; Manufacturer: Samtec; PartNumber: SSW-116-02-G-T; Pitch: 2.54 mm; DatasheetVersion: F-214; PackageVersion: CA, 6/1987; PackageReference: SSW-116-02-X-T; PackageDescription: Assembly, Socket Strip .016 X .031 Tail; Orientation: Vertical; RoHS: True; Temperature Range: -55 to 125 degC; Mounting Technology: Through-hole; ComponentLink1Description: Manufacturer URL; ComponentLink1URL: http://www.samtec.com; ComponentLink2Description: Datasheet; ComponentLink2URL: http://www.samtec.com/documents/webfiles/pdf/SSW_TH.PDF; ComponentLink3Description: Package Specification; ComponentLink3URL: http://www.samtec.com/documents/webfiles/cpdf/SSW-1XX-XX-XXX-X-XX-XXX-XX-MKT.pdf
footprint SMTC-SSW-116-02-X-T (SQ Post Socket, 3x16 Pins, Vertical, 2.54mm Pitch, Female)
pins: 1, 2, 3, 4, 5, 6, 7, 8, 9, 10, 11, 12, 13, 14, 15, 16, 17, 18, 19, 20, 21, 22, 23, 24, 25, 26, 27, 28, 29, 30, 31, 32, 33, 34, 35, 36, 37, 38, 39, 40, 41, 42, 43, 44, 45, 46, 47, 48

## SSW-116-02-L-S
designator J?
SQ Post Socket, Through-hole, Vertical, -55 to 125 degC, 2.54 mm Pitch, 16-Pin, Female, RoHS; Manufacturer: Samtec; PartNumber: SSW-116-02-L-S; Pitch: 2.54 mm; DatasheetVersion: F-214; PackageVersion: CA, 6/1987; PackageReference: SSW-116-02-X-S; PackageDescription: Assembly, Socket Strip .016 X .031 Tail; Orientation: Vertical; RoHS: True; Temperature Range: -55 to 125 degC; Mounting Technology: Through-hole; ComponentLink1Description: Manufacturer URL; ComponentLink1URL: http://www.samtec.com; ComponentLink2Description: Datasheet; ComponentLink2URL: http://www.samtec.com/documents/webfiles/pdf/SSW_TH.PDF; ComponentLink3Description: Package Specification; ComponentLink3URL: http://www.samtec.com/documents/webfiles/cpdf/SSW-1XX-XX-XXX-X-XX-XXX-XX-MKT.pdf
footprint SMTC-SSW-116-02-X-S (SQ Post Socket, 1x16 Pins, Vertical, 2.54mm Pitch, Female)
pins: 1, 2, 3, 4, 5, 6, 7, 8, 9, 10, 11, 12, 13, 14, 15, 16

## SSW-116-02-L-T
designator J?
SQ Post Socket, Through-hole, Vertical, -55 to 125 degC, 2.54 mm Pitch, 48-Pin, Female, RoHS; Manufacturer: Samtec; PartNumber: SSW-116-02-L-T; Pitch: 2.54 mm; DatasheetVersion: F-214; PackageVersion: CA, 6/1987; PackageReference: SSW-116-02-X-T; PackageDescription: Assembly, Socket Strip .016 X .031 Tail; Orientation: Vertical; RoHS: True; Temperature Range: -55 to 125 degC; Mounting Technology: Through-hole; ComponentLink1Description: Manufacturer URL; ComponentLink1URL: http://www.samtec.com; ComponentLink2Description: Datasheet; ComponentLink2URL: http://www.samtec.com/documents/webfiles/pdf/SSW_TH.PDF; ComponentLink3Description: Package Specification; ComponentLink3URL: http://www.samtec.com/documents/webfiles/cpdf/SSW-1XX-XX-XXX-X-XX-XXX-XX-MKT.pdf
footprint SMTC-SSW-116-02-X-T (SQ Post Socket, 3x16 Pins, Vertical, 2.54mm Pitch, Female)
pins: 1, 2, 3, 4, 5, 6, 7, 8, 9, 10, 11, 12, 13, 14, 15, 16, 17, 18, 19, 20, 21, 22, 23, 24, 25, 26, 27, 28, 29, 30, 31, 32, 33, 34, 35, 36, 37, 38, 39, 40, 41, 42, 43, 44, 45, 46, 47, 48

## SSW-116-02-T-S
designator J?
SQ Post Socket, Through-hole, Vertical, -55 to 105 degC, 2.54 mm Pitch, 16-Pin, Female, RoHS; Manufacturer: Samtec; PartNumber: SSW-116-02-T-S; Pitch: 2.54 mm; DatasheetVersion: F-214; PackageVersion: CA, 6/1987; PackageReference: SSW-116-02-X-S; PackageDescription: Assembly, Socket Strip .016 X .031 Tail; Supplier 1: Digi-Key; Supplier Part Number 1: SAM1222-16-ND; Orientation: Vertical; RoHS: True; Temperature Range: -55 to 105 degC; Mounting Technology: Through-hole; ComponentLink1Description: Manufacturer URL; ComponentLink1URL: http://www.samtec.com; ComponentLink2Description: Datasheet; ComponentLink2URL: http://www.samtec.com/documents/webfiles/pdf/SSW_TH.PDF; ComponentLink3Description: Package Specification; ComponentLink3URL: http://www.samtec.com/documents/webfiles/cpdf/SSW-1XX-XX-XXX-X-XX-XXX-XX-MKT.pdf
footprint SMTC-SSW-116-02-X-S (SQ Post Socket, 1x16 Pins, Vertical, 2.54mm Pitch, Female)
pins: 1, 2, 3, 4, 5, 6, 7, 8, 9, 10, 11, 12, 13, 14, 15, 16

## SSW-116-02-T-T
designator J?
SQ Post Socket, Through-hole, Vertical, -55 to 105 degC, 2.54 mm Pitch, 48-Pin, Female, RoHS; Manufacturer: Samtec; PartNumber: SSW-116-02-T-T; Pitch: 2.54 mm; DatasheetVersion: F-214; PackageVersion: CA, 6/1987; PackageReference: SSW-116-02-X-T; PackageDescription: Assembly, Socket Strip .016 X .031 Tail; Orientation: Vertical; RoHS: True; Temperature Range: -55 to 105 degC; Mounting Technology: Through-hole; ComponentLink1Description: Manufacturer URL; ComponentLink1URL: http://www.samtec.com; ComponentLink2Description: Datasheet; ComponentLink2URL: http://www.samtec.com/documents/webfiles/pdf/SSW_TH.PDF; ComponentLink3Description: Package Specification; ComponentLink3URL: http://www.samtec.com/documents/webfiles/cpdf/SSW-1XX-XX-XXX-X-XX-XXX-XX-MKT.pdf
footprint SMTC-SSW-116-02-X-T (SQ Post Socket, 3x16 Pins, Vertical, 2.54mm Pitch, Female)
pins: 1, 2, 3, 4, 5, 6, 7, 8, 9, 10, 11, 12, 13, 14, 15, 16, 17, 18, 19, 20, 21, 22, 23, 24, 25, 26, 27, 28, 29, 30, 31, 32, 33, 34, 35, 36, 37, 38, 39, 40, 41, 42, 43, 44, 45, 46, 47, 48

## SSW-116-03-F-T
designator J?
SQ Post Socket, Through-hole, Vertical, -55 to 125 degC, 2.54 mm Pitch, 48-Pin, Female, RoHS; Manufacturer: Samtec; PartNumber: SSW-116-03-F-T; Pitch: 2.54 mm; DatasheetVersion: F-214; PackageVersion: CA, 6/1987; PackageReference: SSW-116-03-X-T; PackageDescription: Assembly, Socket Strip .016 X .031 Tail; Orientation: Vertical; RoHS: True; Temperature Range: -55 to 125 degC; Mounting Technology: Through-hole; ComponentLink1Description: Manufacturer URL; ComponentLink1URL: http://www.samtec.com; ComponentLink2Description: Datasheet; ComponentLink2URL: http://www.samtec.com/documents/webfiles/pdf/SSW_TH.PDF; ComponentLink3Description: Package Specification; ComponentLink3URL: http://www.samtec.com/documents/webfiles/cpdf/SSW-1XX-XX-XXX-X-XX-XXX-XX-MKT.pdf
footprint SMTC-SSW-116-03-X-T (SQ Post Socket, 3x16 Pins, Vertical, 2.54mm Pitch, Female)
pins: 1, 2, 3, 4, 5, 6, 7, 8, 9, 10, 11, 12, 13, 14, 15, 16, 17, 18, 19, 20, 21, 22, 23, 24, 25, 26, 27, 28, 29, 30, 31, 32, 33, 34, 35, 36, 37, 38, 39, 40, 41, 42, 43, 44, 45, 46, 47, 48

## SSW-116-03-G-T
designator J?
SQ Post Socket, Through-hole, Vertical, -55 to 125 degC, 2.54 mm Pitch, 48-Pin, Female, RoHS; Manufacturer: Samtec; PartNumber: SSW-116-03-G-T; Pitch: 2.54 mm; DatasheetVersion: F-214; PackageVersion: CA, 6/1987; PackageReference: SSW-116-03-X-T; PackageDescription: Assembly, Socket Strip .016 X .031 Tail; Orientation: Vertical; RoHS: True; Temperature Range: -55 to 125 degC; Mounting Technology: Through-hole; ComponentLink1Description: Manufacturer URL; ComponentLink1URL: http://www.samtec.com; ComponentLink2Description: Datasheet; ComponentLink2URL: http://www.samtec.com/documents/webfiles/pdf/SSW_TH.PDF; ComponentLink3Description: Package Specification; ComponentLink3URL: http://www.samtec.com/documents/webfiles/cpdf/SSW-1XX-XX-XXX-X-XX-XXX-XX-MKT.pdf
footprint SMTC-SSW-116-03-X-T (SQ Post Socket, 3x16 Pins, Vertical, 2.54mm Pitch, Female)
pins: 1, 2, 3, 4, 5, 6, 7, 8, 9, 10, 11, 12, 13, 14, 15, 16, 17, 18, 19, 20, 21, 22, 23, 24, 25, 26, 27, 28, 29, 30, 31, 32, 33, 34, 35, 36, 37, 38, 39, 40, 41, 42, 43, 44, 45, 46, 47, 48

## SSW-116-03-L-T
designator J?
SQ Post Socket, Through-hole, Vertical, -55 to 125 degC, 2.54 mm Pitch, 48-Pin, Female, RoHS; Manufacturer: Samtec; PartNumber: SSW-116-03-L-T; Pitch: 2.54 mm; DatasheetVersion: F-214; PackageVersion: CA, 6/1987; PackageReference: SSW-116-03-X-T; PackageDescription: Assembly, Socket Strip .016 X .031 Tail; Orientation: Vertical; RoHS: True; Temperature Range: -55 to 125 degC; Mounting Technology: Through-hole; ComponentLink1Description: Manufacturer URL; ComponentLink1URL: http://www.samtec.com; ComponentLink2Description: Datasheet; ComponentLink2URL: http://www.samtec.com/documents/webfiles/pdf/SSW_TH.PDF; ComponentLink3Description: Package Specification; ComponentLink3URL: http://www.samtec.com/documents/webfiles/cpdf/SSW-1XX-XX-XXX-X-XX-XXX-XX-MKT.pdf
footprint SMTC-SSW-116-03-X-T (SQ Post Socket, 3x16 Pins, Vertical, 2.54mm Pitch, Female)
pins: 1, 2, 3, 4, 5, 6, 7, 8, 9, 10, 11, 12, 13, 14, 15, 16, 17, 18, 19, 20, 21, 22, 23, 24, 25, 26, 27, 28, 29, 30, 31, 32, 33, 34, 35, 36, 37, 38, 39, 40, 41, 42, 43, 44, 45, 46, 47, 48
